# Altium footprint library xhayqua.PcbLib: 185 footprints (part 1 of 12)
Each footprint in its own frame and in the unit in brackets; x right, y up, seen from the top. Pads: shape width x height; smd on the part's side, far side on the other; paste and mask are expansions set on the pad; w line width, h text height; cw(c..) or ccw(c..) is an arc to the next point about the centre after c.
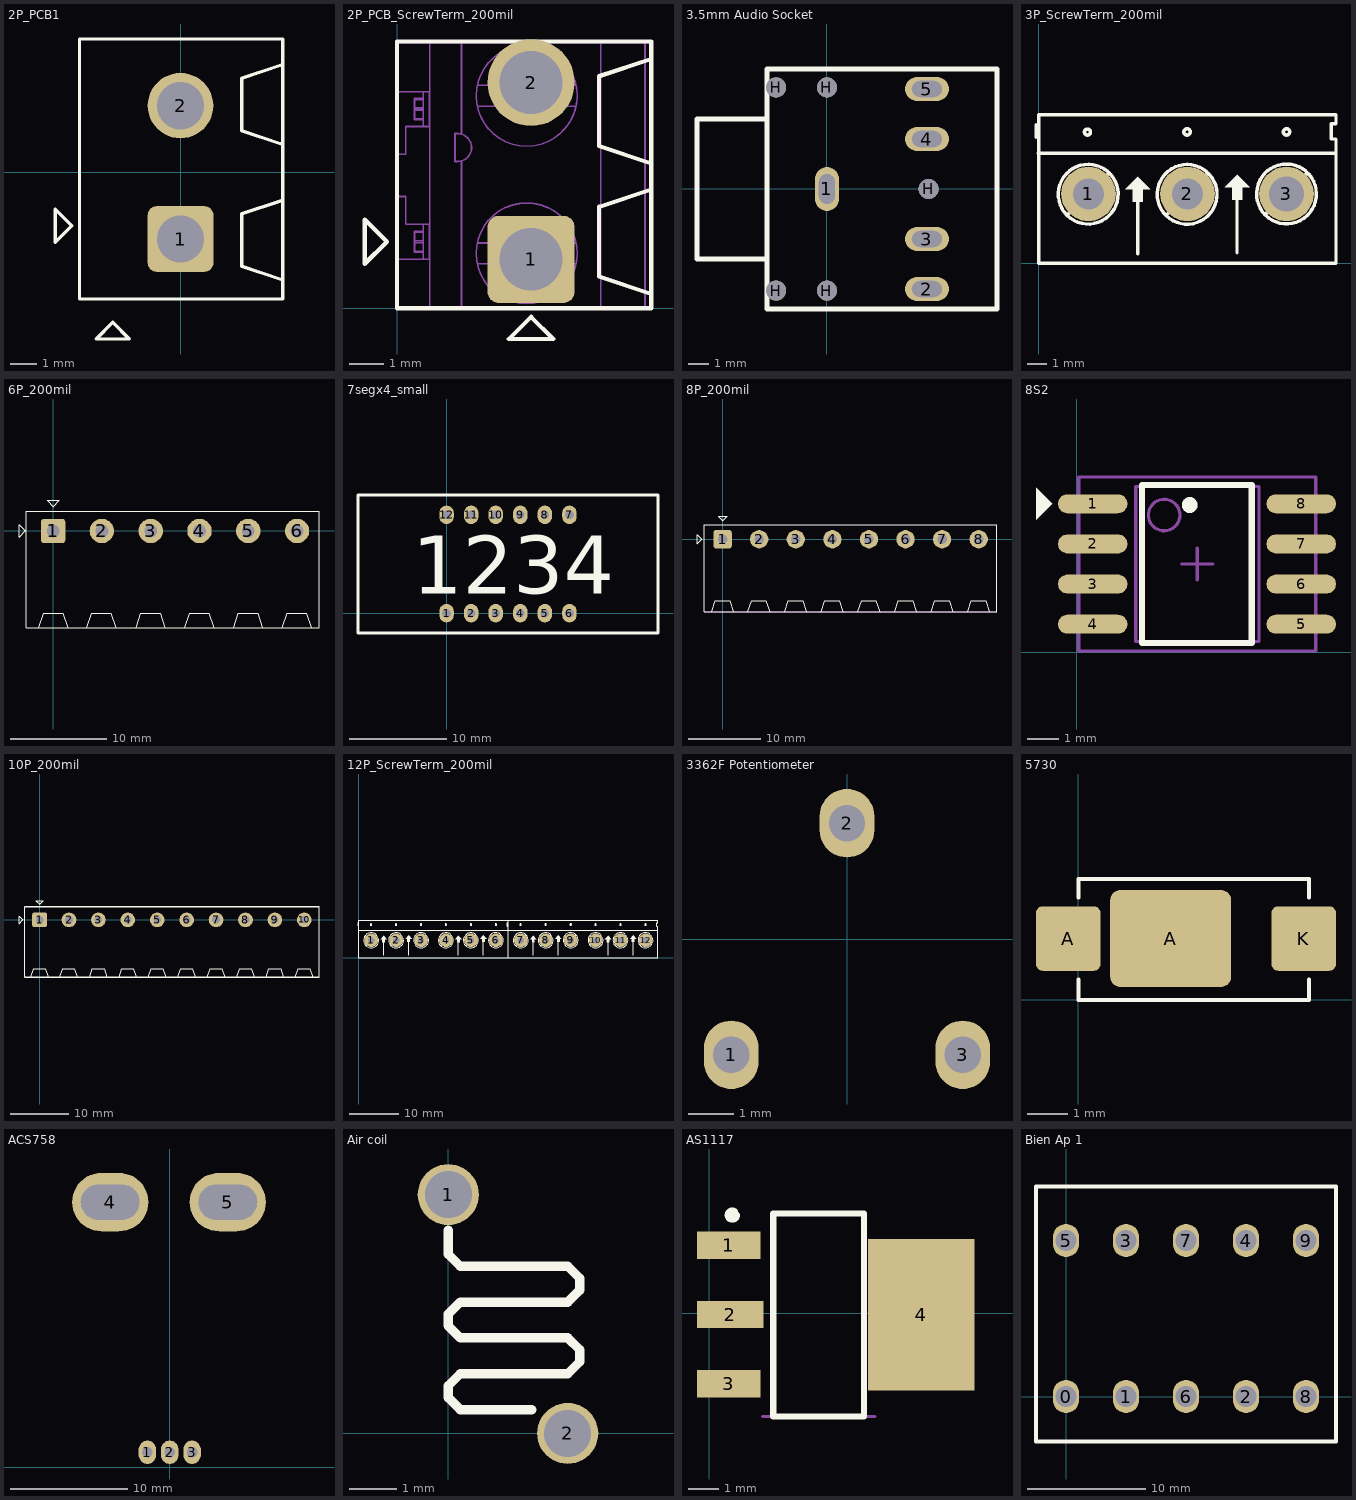
[diagram p0: the footprints below, top view; thin cyan lines are the x and y axes]

## 2P_PCB1 [mm]
pads (2):
  rrect25% 2.5x2.5 hole 1.8: 1(0,-2.54)
  round 2.5 hole 1.8: 2(0,2.54)
Top Overlay:
  lines w0.127: 3.831,-4.08 2.331,-3.58 2.331,-1.58 3.831,-1.08 ; 3.831,1.084 2.331,1.584 2.331,3.584 3.831,4.084 ; -4.775,-2.667 -4.14,-2.032 -4.775,-1.397 -4.775,-2.667 ; -3.85,-4.826 -3.85,5.08 3.897,5.08 3.897,-4.826 -3.85,-4.826 ; -3.215,-6.35 -1.945,-6.35 -2.58,-5.715 -3.215,-6.35
3D body "User Library-Terminal-Screw-3A-2way.step": height 10.01, standoff -2.99, extent -3.713,-5.473 3.887,5.127

## 2P_PCB_ScrewTerm_200mil [mm]
pads (2):
  rrect25% 2.5x2.5 hole 1.8: 1(3.85,1.397)
  round 2.5 hole 1.8: 2(3.85,6.477)
Top Overlay:
  lines w0.127: 7.3,0.405 5.8,0.905 5.8,2.905 7.3,3.405 ; 7.3,4.155 5.8,4.655 5.8,6.655 7.3,7.155 ; -0.925,1.27 -0.29,1.905 -0.925,2.54 -0.925,1.27 ; 0,0 0,7.655 7.3,7.655 7.3,0 0,0 ; 3.215,-0.889 4.485,-0.889 3.85,-0.254 3.215,-0.889
Mechanical 13:
  circle w0.05: c3.723,1.57 r1.45
  circle w0.05: c3.723,6.096 r1.45
  lines w0.05: 0,1.405 0.935,1.405 0.935,2.405 0.25,2.405 0.25,3.205 0,3.205 ; 0,4.415 0.25,4.415 0.25,5.215 0.935,5.215 0.935,6.215 0,6.215 ; 0.5,1.628 0.75,1.628 ; 0.5,1.878 0.75,1.878 ; 0.5,1.932 0.75,1.932 ; 0.5,2.182 0.75,2.182 ; 0.5,5.438 0.75,5.438 ; 0.5,5.688 0.75,5.688 ; 0.5,5.742 0.75,5.742 ; 0.5,5.992 0.75,5.992 ; 0.75,1.405 0.75,2.405 ; 0.75,1.605 0.5,1.605 0.5,2.205 0.75,2.205 ; 0.75,5.215 0.75,6.215 ; 0.75,5.415 0.5,5.415 0.5,6.015 0.75,6.015 ; 0.94,0 0.94,7.62 ; 1.85,0 1.85,4.225 ; 1.85,4.995 1.85,7.62 ; 2.304,1.27 5.142,1.27 ; 2.304,1.87 5.142,1.87 ; 2.304,5.796 5.142,5.796 ; 2.304,6.396 5.142,6.396 ; 5.85,0 5.85,7.62 ; 7.124,0 7.124,7.62 ; 0,0 0,7.62 7.3,7.62 7.3,0 0,0 ; 1.668,4.21 1.741,4.21 ccw(c1.741,4.61) 1.741,5.01 1.668,5.01 1.668,4.21
3D body "c-1776113-2-o-3d.stp": height 8.5, standoff -3.5, extent 0,-0.005 7.3,7.615

## 3.5mm Audio Socket [mm]
pads (10):
  oval 1.2x2.2 hole 0.8 slot 1.5 at 90 deg: 1(0,0)
  oval 2.2x1.2 hole 0.8 slot 1.5 at 0 deg: 2(5,-5) 3(5,-2.5) 4(5,2.5) 5(5,5)
  round 1 hole 1: H(-2.54,-5.08) H(-2.54,5.08) H(0,-5.08) H(0,5.08) H(5.08,0)
Top Overlay:
  lines w0.254: -3,-3.5 -6.5,-3.5 -6.5,3.5 -3,3.5 ; -3,-6 8.5,-6 8.5,6 -3,6 -3,-6
3D body "User Library-PJS_05_LB_H.step": height 10.51, standoff -3.62, extent -6.5,-6 8.5,6

## 3P_ScrewTerm_200mil [mm]
pads (3):
  round 2.8 hole 1.6: 1(2.54,3.556) 2(7.62,3.556)
  round 2.8 hole 1.8: 3(12.7,3.556)
Top Overlay:
  circle w0.178: c7.598,6.739 r0.163
  circle w0.178: c2.487,6.731 r0.155
  circle w0.178: c12.7,6.739 r0.163
  region: 5.067,4.432 4.432,3.797 4.813,3.797 4.813,3.162 5.321,3.162 5.321,3.797 5.702,3.797
  region: 10.173,4.534 9.538,3.899 9.919,3.899 9.919,3.264 10.427,3.264 10.427,3.899 10.808,3.899
  lines w0.178: -0.152,6.477 -0.152,7.112 ; -0.025,5.639 15.215,5.639 ; 1.46,2.476 3.619,4.635 ; 3.529,4.704 ccw(c2.527,3.543) 3.67,4.567 ; 5.08,0.483 5.08,4.318 ; 6.547,2.483 8.693,4.629 ; 8.589,4.71 ccw(c7.601,3.537) 8.754,4.548 ; 10.16,0.533 10.16,4.369 ; 11.617,2.499 13.776,4.632 ; 13.691,4.726 ccw(c12.7,3.556) 13.858,4.561 ; 0,0 15.24,0 15.24,6.375 14.986,6.375 14.986,7.163 15.24,7.163 15.24,7.62 0,7.62 0,3.81 0,0
3D body "SW3DPS-HDR1x3-MED-GREEN.STEP": height 10, standoff -4, extent 0.12,0 15.12,7.5

## 6P_200mil [mil]
pads (6):
  rrect25% 100x100 hole 52: 1(0,0)
  round 100 hole 52: 2(200,0) 3(400,0) 4(600,0) 5(800,0) 6(1000,0)
Top Overlay:
  lines w5: -59.06,-395.83 -39.37,-336.78 39.37,-336.78 59.06,-395.83 ; 138.58,-395.83 158.27,-336.78 237.01,-336.78 256.69,-395.83 ; 340,-395.83 359.69,-336.78 438.43,-336.78 458.11,-395.83 ; 540,-395.83 559.68,-336.78 638.43,-336.78 658.11,-395.83 ; 740,-395.83 759.68,-336.78 838.43,-336.78 858.11,-395.83 ; 940,-395.83 959.68,-336.78 1038.43,-336.78 1058.11,-395.83 ; -140,-25 -115,0 -140,25 -140,-25 ; -110,-395.83 -110,80 1090,80 1090,-395.83 -110,-395.83 ; -25,125 0,100 25,125 -25,125
3D body "User Library-MSTB 2,5-6-G-5,08 1759059.STEP": height 338.58, standoff -137.8, extent -107.87,-393.7 1092.13,78.83

## 7segx4_small [mm]
pads (12):
  oval 1.5x1.9 hole 0.9: 1(0,0) 2(2.54,0) 3(5.08,0) 4(7.62,0) 5(10.16,0) 6(12.7,0) 7(12.7,10.16) 8(10.16,10.16) 9(7.62,10.16) 10(5.08,10.16) 11(2.54,10.16) 12(0,10.16)
Top Overlay:
  lines w0.3: -9.144,-2.032 21.844,-2.032 21.844,12.192 -9.144,12.192 -9.144,-2.032
  text "1234" at -3.556,2.032 h6
3D body "User Library-7-seg-4_asm.STEP": height 7, standoff -6.2, extent -8.664,-1.92 21.336,12.08

## 8P_200mil [mil]
pads (8):
  rrect25% 100x100 hole 52: 1(0,0)
  round 100 hole 52: 2(200,0) 3(400,0) 4(600,0) 5(800,0) 6(1000,0) 7(1200,0) 8(1400,0)
Top Overlay:
  lines w5: -59.06,-395.83 -39.37,-336.78 39.37,-336.78 59.06,-395.83 ; 138.58,-395.83 158.27,-336.78 237.01,-336.78 256.69,-395.83 ; 340,-395.83 359.69,-336.78 438.43,-336.78 458.11,-395.83 ; 540,-395.83 559.68,-336.78 638.43,-336.78 658.11,-395.83 ; 740,-395.83 759.68,-336.78 838.43,-336.78 858.11,-395.83 ; 940,-395.83 959.68,-336.78 1038.43,-336.78 1058.11,-395.83 ; 1140,-395.83 1159.68,-336.78 1238.43,-336.78 1258.11,-395.83 ; 1340,-395.83 1359.68,-336.78 1438.43,-336.78 1458.11,-395.83 ; -140,-25 -115,0 -140,25 -140,-25 ; -100,-395.83 -100,80 1500,80 1500,-395.83 -100,-395.83 ; -25,125 0,100 25,125 -25,125
Mechanical 13:
  lines w3: -100,-395.83 1500,-395.83
3D body "User Library-MSTB 2,5-8-G-5,08 1759075.STEP": height 338.58, standoff -137.8, extent -100,-396.27 1500,76.27

## 8S2 [mm]
pads (8):
  oval 2.2x0.6 smd: 1(0.5,4.699) 2(0.5,3.429) 3(0.5,2.159) 4(0.5,0.889) 5(7.1,0.889) 6(7.1,2.159) 7(7.1,3.429) 8(7.1,4.699)
Top Overlay:
  circle w0.25: c3.569,4.66 r0.125
  region: -1.295,4.191 -0.787,4.699 -1.295,5.207
  lines w0.2: 2.057,0.294 5.537,0.294 5.537,5.294 2.057,5.294 2.057,0.294
Mechanical 13:
  circle w0.1: c2.76,4.344 r0.5
  lines w0.1: 1.86,0.344 5.76,0.344 5.76,5.244 1.86,5.244 1.86,0.344
Mechanical 15:
  lines w0.1: 3.31,2.794 4.31,2.794 ; 3.81,2.294 3.81,3.294 ; 0.06,0.044 7.56,0.044 7.56,5.544 0.06,5.544 0.06,0.044
3D body: height 1.75, standoff 0, extent 1.86,0.344 5.76,5.244

## 10P_200mil [mil]
pads (10):
  rrect25% 100x100 hole 52: 1(0,0)
  round 100 hole 52: 2(200,0) 3(400,0) 4(600,0) 5(800,0) 6(1000,0) 7(1200,0) 8(1400,0) 9(1600,0) 10(1800,0)
Top Overlay:
  lines w5: -59.06,-390 -39.37,-330.94 39.37,-330.94 59.06,-390 ; 138.58,-390 158.27,-330.94 237.01,-330.94 256.69,-390 ; 340,-390 359.69,-330.94 438.43,-330.94 458.11,-390 ; 540,-390 559.68,-330.94 638.43,-330.94 658.11,-390 ; 740,-390 759.68,-330.94 838.43,-330.94 858.11,-390 ; 940,-390 959.68,-330.94 1038.43,-330.94 1058.11,-390 ; 1140,-390 1159.68,-330.94 1238.43,-330.94 1258.11,-390 ; 1340,-390 1359.68,-330.94 1438.43,-330.94 1458.11,-390 ; 1540,-390 1559.68,-330.94 1638.43,-330.94 1658.11,-390 ; 1740,-390 1759.68,-330.94 1838.43,-330.94 1858.11,-390 ; -140,-25 -115,0 -140,25 -140,-25 ; -25,130 0,105 25,130 -25,130
  lines w8: -100,-390 -100,90 ; 1900,-390 1900,90
  lines w10: -100,-390 1900,-390 ; -100,90 1900,90
3D body "User Library-MSTB 2,5-10-G-5,08 1759091.STEP": height 338.58, standoff -137.8, extent -100,-390 1900,82.53

## 12P_ScrewTerm_200mil [mil]
pads (12):
  round 110 hole 50: 1(100,140) 2(300,140) 3(500,140) 4(700,140) 5(900,140) 6(1100,140) 7(1300,140) 8(1500,140) 9(1700,140) 10(1900,140) 11(2100,140) 12(2300,140)
Top Overlay:
  circle w7: c2099.12,265.32 r6.4
  circle w7: c1897.92,265 r6.08
  circle w7: c2300,265.32 r6.4
  circle w7: c1499.12,265.32 r6.4
  circle w7: c1297.92,265 r6.08
  circle w7: c1700,265.32 r6.4
  circle w7: c500,265.32 r6.4
  circle w7: c97.92,265 r6.08
  circle w7: c299.12,265.32 r6.4
  circle w7: c1100,265.32 r6.4
  circle w7: c697.92,265 r6.08
  circle w7: c899.12,265.32 r6.4
  region: 1999.5,174.5 1974.5,149.5 1989.5,149.5 1989.5,124.5 2009.5,124.5 2009.5,149.5 2024.5,149.5
  region: 2200.5,178.5 2175.5,153.5 2190.5,153.5 2190.5,128.5 2210.5,128.5 2210.5,153.5 2225.5,153.5
  region: 1399.5,174.5 1374.5,149.5 1389.5,149.5 1389.5,124.5 1409.5,124.5 1409.5,149.5 1424.5,149.5
  region: 1600.5,178.5 1575.5,153.5 1590.5,153.5 1590.5,128.5 1610.5,128.5 1610.5,153.5 1625.5,153.5
  region: 400.5,178.5 375.5,153.5 390.5,153.5 390.5,128.5 410.5,128.5 410.5,153.5 425.5,153.5
  region: 199.5,174.5 174.5,149.5 189.5,149.5 189.5,124.5 209.5,124.5 209.5,149.5 224.5,149.5
  region: 1000.5,178.5 975.5,153.5 990.5,153.5 990.5,128.5 1010.5,128.5 1010.5,153.5 1025.5,153.5
  region: 799.5,174.5 774.5,149.5 789.5,149.5 789.5,124.5 809.5,124.5 809.5,149.5 824.5,149.5
  lines w7: -6,255 -6,280 ; -1,222 599,222 1199,222 1799,222 2399,222 ; 57.5,97.5 142.5,182.5 ; 138.94,185.21 ccw(c99.5,139.5) 144.47,179.78 ; 200,19 200,170 ; 257.75,97.75 342.25,182.25 ; 338.14,185.43 ccw(c299.25,139.25) 344.63,179.07 ; 400,21 400,172 ; 457.38,98.38 542.38,182.38 ; 539.03,186.06 ccw(c500,140) 545.6,179.57 ; 657.5,97.5 742.5,182.5 ; 738.94,185.21 ccw(c699.5,139.5) 744.47,179.78 ; 800,19 800,170 ; 857.75,97.75 942.25,182.25 ; 938.14,185.43 ccw(c899.25,139.25) 944.63,179.07 ; 1000,21 1000,172 ; 1057.38,98.38 1142.38,182.38 ; 1139.03,186.06 ccw(c1100,140) 1145.6,179.57 ; 1194,255 1194,280 ; 1257.5,97.5 1342.5,182.5 ; 1338.94,185.21 ccw(c1299.5,139.5) 1344.47,179.78 ; 1400,19 1400,170 ; 1457.75,97.75 1542.25,182.25 ; 1538.14,185.43 ccw(c1499.25,139.25) 1544.63,179.07 ; 1600,21 1600,172 ; 1657.38,98.38 1742.38,182.38 ; 1739.03,186.06 ccw(c1700,140) 1745.6,179.57 ; 1857.5,97.5 1942.5,182.5 ; 1938.94,185.21 ccw(c1899.5,139.5) 1944.47,179.78 ; 2000,19 2000,170 ; 2057.75,97.75 2142.25,182.25 ; 2138.14,185.43 ccw(c2099.25,139.25) 2144.63,179.07 ; 2200,21 2200,172 ; 2257.38,98.38 2342.38,182.38 ; 2339.03,186.06 ccw(c2300,140) 2345.6,179.57 ; 1200,0 1800,0 2400,0 2400,251 2390,251 2390,282 2400,282 2400,300 1800,300 1200,300 ; 1200,0 1200,150 1200,300 ; 1200,0 1200,251 1190,251 1190,282 1200,282 1200,300 ; 1200,0 600,0 0,0 0,150 0,300 600,300 1200,300
3D body "SW3DPS-HDR1x3-MED-GREEN.STEP": height 393.7, standoff -157.48, extent 1804.72,0 2395.28,295.28
3D body "SW3DPS-HDR1x3-MED-GREEN.STEP": height 393.7, standoff -157.48, extent 1204.72,0 1795.28,295.28
3D body "SW3DPS-HDR1x3-MED-GREEN.STEP": height 393.7, standoff -157.48, extent 4.72,0 595.28,295.28
3D body "SW3DPS-HDR1x3-MED-GREEN.STEP": height 393.7, standoff -157.48, extent 604.72,0 1195.28,295.28

## 3362F Potentiometer [mm]
pads (3):
  oval 1.2x1.5 hole 0.8: 1(-2.54,-2.54) 2(0,2.54) 3(2.54,-2.54)
3D body "3362F Potentiometer.x_b": height 5.7, standoff -4.47, extent -3.3,-3.754 3.3,3.3

## 5730 [mm]
pads (3):
  rrect20% 1.6x1.6 smd: A(-0.254,1.524) K(5.588,1.524)
  rrect20% 3x2.4 smd: A(2.286,1.524)
Top Overlay:
  lines w0.1: 0,0.508 0,0 5.715,0 5.715,0.508 ; 0,2.54 0,2.997 5.715,2.997 5.715,2.54
3D body "User Library-PLCC-2white.STEP": height 0.9, standoff 0, extent 0.02,-0.001 5.72,2.999

## ACS758 [mm]
pads (5):
  oval 1.5x2 hole 0.9: 1(-1.905,1.27) 2(0,1.27) 3(1.905,1.27)
  oval 6.5x5 hole 3 slot 5 at 0 deg: 4(-5.08,22.606) 5(4.953,22.606)
3D body "User Library-ACS758xCB-PFF.STEP": height 7.3, standoff -3.18, extent -7.028,1.033 6.972,23.443

## Air coil [mm]
pads (2):
  round 1.3 hole 1: 1(0,5.08) 2(2.54,0)
Top Overlay:
  lines w0.2: 0,4.318 0,3.81 0.254,3.556 2.54,3.556 2.794,3.302 2.794,3.048 2.54,2.794 1.524,2.794 0.254,2.794 0,2.54 0,2.286 0.254,2.032 2.54,2.032 2.794,1.778 2.794,1.524 2.54,1.27 1.778,1.27 0.254,1.27 0,1.016 0,0.762 0.254,0.508 1.016,0.508 1.778,0.508
3D body "Coilcraft-1111SQ-43N.X_T": height 1.16, standoff -1.63, extent 0.024,0.865 2.845,4.165

## AS1117 [mm]
pads (4):
  rect 2.1x0.9 smd: 1(0.654,2.236) 3(0.654,-2.336)
  rect 2.2x0.9 smd: 2(0.705,-0.05)
  rect 3.5x5 smd: 4(7.004,-0.05)
Top Overlay:
  lines w0.2: 2.119,-3.418 5.119,-3.418 5.119,3.282 2.119,3.282 2.119,-3.418
  lines w0.25: 0.826,3.343 ccw(c0.769,3.232) 0.894,3.232
Mechanical 13:
  lines w0.1: 1.769,-3.418 5.469,-3.418
3D body "SOT223.step": height 1.74, standoff 0.06, extent -0.007,-3.3 6.953,3.2

## Bien Ap 1 [mm]
pads (10):
  oval 2.2x2.8 hole 1.8: 0(0,0) 1(5.08,0) 2(15.24,0) 3(5.08,13.208) 4(15.24,13.208) 5(0,13.208) 6(10.16,0) 7(10.16,13.208) 8(20.32,0) 9(20.32,13.208)
Top Overlay:
  lines w0.3: -2.54,-3.81 -2.54,17.78 22.86,17.78 22.86,-3.81 -2.54,-3.81